# Altium footprint library ADP_SMT.PcbLib: 210 footprints (part 2 of 15)
Each footprint in its own frame and in the unit in brackets; x right, y up, seen from the top. Pads: shape width x height; smd on the part's side, far side on the other; paste and mask are expansions set on the pad; w line width, h text height; cw(c..) or ccw(c..) is an arc to the next point about the centre after c.
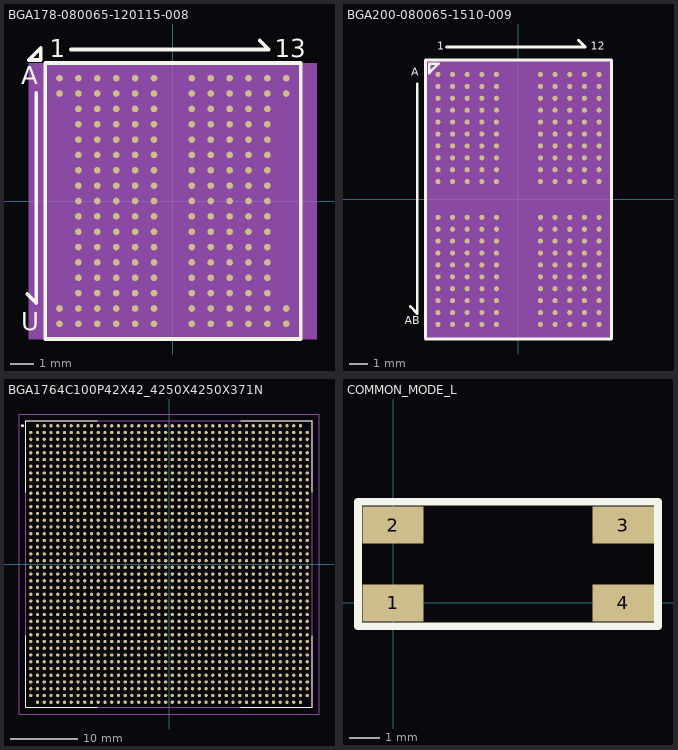
[diagram p1: the footprints below, top view; thin cyan lines are the x and y axes]

## BGA178-080065-120115-008 [mil] "BGA178-080065-120115-008"
pads (178):
  round 11 smd: A1(-189,204.72) A2(-157.5,204.72) A3(-126,204.72) A4(-94.5,204.72) A5(-63,204.72) A6(-31.5,204.72) A8(31.5,204.72) A9(63,204.72) A10(94.5,204.72) A11(126,204.72) A12(157.5,204.72) A13(189,204.72) B1(-189,179.13) B2(-157.5,179.13) B3(-126,179.13) B4(-94.5,179.13) B5(-63,179.13) B6(-31.5,179.13) B8(31.5,179.13) B9(63,179.13) B10(94.5,179.13) B11(126,179.13) B12(157.5,179.13) B13(189,179.13) C2(-157.5,153.54) C3(-126,153.54) C4(-94.5,153.54) C5(-63,153.54) C6(-31.5,153.54) C8(31.5,153.54) C9(63,153.54) C10(94.5,153.54) C11(126,153.54) C12(157.5,153.54) D2(-157.5,127.95) D3(-126,127.95) D4(-94.5,127.95) D5(-63,127.95) D6(-31.5,127.95) D8(31.5,127.95) D9(63,127.95) D10(94.5,127.95) D11(126,127.95) D12(157.5,127.95) E2(-157.5,102.36) E3(-126,102.36) E4(-94.5,102.36) E5(-63,102.36) E6(-31.5,102.36) E8(31.5,102.36) E9(63,102.36) E10(94.5,102.36) E11(126,102.36) E12(157.5,102.36) F2(-157.5,76.77) F3(-126,76.77) F4(-94.5,76.77) F5(-63,76.77) F6(-31.5,76.77) F8(31.5,76.77) F9(63,76.77) F10(94.5,76.77) F11(126,76.77) F12(157.5,76.77) G2(-157.5,51.18) G3(-126,51.18) G4(-94.5,51.18) G5(-63,51.18) G6(-31.5,51.18) G8(31.5,51.18) G9(63,51.18) G10(94.5,51.18) G11(126,51.18) G12(157.5,51.18) H2(-157.5,25.59) H3(-126,25.59) H4(-94.5,25.59) H5(-63,25.59) H6(-31.5,25.59) H8(31.5,25.59) H9(63,25.59) H10(94.5,25.59) H11(126,25.59) H12(157.5,25.59) J2(-157.5,0) J3(-126,0) J4(-94.5,0) J5(-63,0) J6(-31.5,0) J8(31.5,0) J9(63,0) J10(94.5,0) J11(126,0) J12(157.5,0) K2(-157.5,-25.59) K3(-126,-25.59) K4(-94.5,-25.59) K5(-63,-25.59) K6(-31.5,-25.59) K8(31.5,-25.59) K9(63,-25.59) K10(94.5,-25.59) K11(126,-25.59) K12(157.5,-25.59) L2(-157.5,-51.18) L3(-126,-51.18) L4(-94.5,-51.18) L5(-63,-51.18) L6(-31.5,-51.18) L8(31.5,-51.18) L9(63,-51.18) L10(94.5,-51.18) L11(126,-51.18) L12(157.5,-51.18) M2(-157.5,-76.77) M3(-126,-76.77) M4(-94.5,-76.77) M5(-63,-76.77) M6(-31.5,-76.77) M8(31.5,-76.77) M9(63,-76.77) M10(94.5,-76.77) M11(126,-76.77) M12(157.5,-76.77) N2(-157.5,-102.36) N3(-126,-102.36) N4(-94.5,-102.36) N5(-63,-102.36) N6(-31.5,-102.36) N8(31.5,-102.36) N9(63,-102.36) N10(94.5,-102.36) N11(126,-102.36) N12(157.5,-102.36) P2(-157.5,-127.95) P3(-126,-127.95) P4(-94.5,-127.95) P5(-63,-127.95) P6(-31.5,-127.95) P8(31.5,-127.95) P9(63,-127.95) P10(94.5,-127.95) P11(126,-127.95) P12(157.5,-127.95) R2(-157.5,-153.54) R3(-126,-153.54) R4(-94.5,-153.54) R5(-63,-153.54) R6(-31.5,-153.54) R8(31.5,-153.54) R9(63,-153.54) R10(94.5,-153.54) R11(126,-153.54) R12(157.5,-153.54) T1(-189,-179.13) T2(-157.5,-179.13) T3(-126,-179.13) T4(-94.5,-179.13) T5(-63,-179.13) T6(-31.5,-179.13) T8(31.5,-179.13) T9(63,-179.13) T10(94.5,-179.13) T11(126,-179.13) T12(157.5,-179.13) T13(189,-179.13) U1(-189,-204.72) U2(-157.5,-204.72) U3(-126,-204.72) U4(-94.5,-204.72) U5(-63,-204.72) U6(-31.5,-204.72) U8(31.5,-204.72) U9(63,-204.72) U10(94.5,-204.72) U11(126,-204.72) U12(157.5,-204.72) U13(189,-204.72)
Top Overlay:
  lines w6: -243,-155 -228,-170 -228,180 ; -170,252.5 160,252.5 145,267.5 ; -240,235 -220,235 -220,255 -240,235 ; -213,-230 213,-230 213,230 -213,230 -213,-230
  text "13" at 170,240 h30
  text "1" at -205,240 h30
  text "U" at -253,-215 h30
  text "A" at -253,195 h30
Mechanical 6:
  text "BGA178-080065" at -185,275 h30
Top 3D Body:
  region: -240,230 -240,-230 240,-230 240,230
Top Assembly:
  text "K9" at 71,-27.57 h0.01
  text "C4" at -86.5,151.56 h0.01
  text "K4" at -86.5,-27.57 h0.01
  text "L4" at -86.5,-53.16 h0.01
  text "B4" at -86.5,177.15 h0.01
  text "U12" at 165.5,-206.7 h0.01
  text "B13" at 197,177.15 h0.01
  text "A13" at 197,202.74 h0.01
  text "B1" at -181,177.15 h0.01
  text "T1" at -181,-181.11 h0.01
  text "T13" at 197,-181.11 h0.01
  text "U1" at -181,-206.7 h0.01
  text "U13" at 197,-206.7 h0.01
  text "U2" at -149.5,-206.7 h0.01
  text "A1" at -181,202.74 h0.01
  text "A2" at -149.5,202.74 h0.01
  text "A12" at 165.5,202.74 h0.01
  text "F12" at 165.5,74.79 h0.01
  text "G9" at 71,49.2 h0.01
  text "M4" at -86.5,-78.75 h0.01
  text "C5" at -55,151.56 h0.01
  text "B5" at -55,177.15 h0.01
  text "F5" at -55,74.79 h0.01
  text "F6" at -23.5,74.79 h0.01
  text "H2" at -149.5,23.61 h0.01
  text "N4" at -86.5,-104.34 h0.01
  text "P3" at -118,-129.93 h0.01
  text "P12" at 165.5,-129.93 h0.01
  text "T12" at 165.5,-181.11 h0.01
  text "J12" at 165.5,-1.98 h0.01
  text "M12" at 165.5,-78.75 h0.01
  text "D12" at 165.5,125.97 h0.01
  text "B12" at 165.5,177.15 h0.01
  text "L9" at 71,-53.16 h0.01
  text "K10" at 102.5,-27.57 h0.01
  text "H10" at 102.5,23.61 h0.01
  text "R4" at -86.5,-155.52 h0.01
  text "T2" at -149.5,-181.11 h0.01
  text "T3" at -118,-181.11 h0.01
  text "T4" at -86.5,-181.11 h0.01
  text "T5" at -55,-181.11 h0.01
  text "T6" at -23.5,-181.11 h0.01
  text "J4" at -86.5,-1.98 h0.01
  text "K2" at -149.5,-27.57 h0.01
  text "M5" at -55,-78.75 h0.01
  text "L6" at -23.5,-53.16 h0.01
  text "N5" at -55,-104.34 h0.01
  text "E6" at -23.5,100.38 h0.01
  text "F4" at -86.5,74.79 h0.01
  text "E5" at -55,100.38 h0.01
  text "G4" at -86.5,49.2 h0.01
  text "E4" at -86.5,100.38 h0.01
  text "D3" at -118,125.97 h0.01
  text "B6" at -23.5,177.15 h0.01
  text "C3" at -118,151.56 h0.01
  text "B2" at -149.5,177.15 h0.01
  text "M6" at -23.5,-78.75 h0.01
  text "G3" at -118,49.2 h0.01
  text "R6" at -23.5,-155.52 h0.01
  text "R5" at -55,-155.52 h0.01
  text "C6" at -23.5,151.56 h0.01
  text "G6" at -23.5,49.2 h0.01
  text "N6" at -23.5,-104.34 h0.01
  text "P9" at 71,-129.93 h0.01
  text "N9" at 71,-104.34 h0.01
  text "N10" at 102.5,-104.34 h0.01
  text "N11" at 134,-104.34 h0.01
  text "M8" at 39.5,-78.75 h0.01
  text "M9" at 71,-78.75 h0.01
  text "M10" at 102.5,-78.75 h0.01
  text "M11" at 134,-78.75 h0.01
  text "F11" at 134,74.79 h0.01
  text "F10" at 102.5,74.79 h0.01
  text "F9" at 71,74.79 h0.01
  text "F8" at 39.5,74.79 h0.01
  text "E11" at 134,100.38 h0.01
  text "E10" at 102.5,100.38 h0.01
  text "E9" at 71,100.38 h0.01
  text "D9" at 71,125.97 h0.01
  text "T8" at 39.5,-181.11 h0.01
  text "T9" at 71,-181.11 h0.01
  text "T10" at 102.5,-181.11 h0.01
  text "T11" at 134,-181.11 h0.01
  text "R8" at 39.5,-155.52 h0.01
  text "R9" at 71,-155.52 h0.01
  text "R10" at 102.5,-155.52 h0.01
  text "R11" at 134,-155.52 h0.01
  text "C11" at 134,151.56 h0.01
  text "C10" at 102.5,151.56 h0.01
  text "C9" at 71,151.56 h0.01
  text "C8" at 39.5,151.56 h0.01
  text "B11" at 134,177.15 h0.01
  text "B10" at 102.5,177.15 h0.01
  text "B9" at 71,177.15 h0.01
  text "B8" at 39.5,177.15 h0.01
  text "R2" at -149.5,-155.52 h0.01
  text "P2" at -149.5,-129.93 h0.01
  text "N2" at -149.5,-104.34 h0.01
  text "N3" at -118,-104.34 h0.01
  text "M3" at -118,-78.75 h0.01
  text "F3" at -118,74.79 h0.01
  text "E3" at -118,100.38 h0.01
  text "E2" at -149.5,100.38 h0.01
  text "D2" at -149.5,125.97 h0.01
  text "C2" at -149.5,151.56 h0.01
  text "J2" at -149.5,-1.98 h0.01
  text "J3" at -118,-1.98 h0.01
  text "L3" at -118,-53.16 h0.01
  text "K3" at -118,-27.57 h0.01
  text "L11" at 134,-53.16 h0.01
  text "P11" at 134,-129.93 h0.01
  text "D11" at 134,125.97 h0.01
  text "D10" at 102.5,125.97 h0.01
  text "P10" at 102.5,-129.93 h0.01
  text "G10" at 102.5,49.2 h0.01
  text "L10" at 102.5,-53.16 h0.01
  text "G11" at 134,49.2 h0.01
  text "L8" at 39.5,-53.16 h0.01
  text "G8" at 39.5,49.2 h0.01
  text "P8" at 39.5,-129.93 h0.01
  text "D8" at 39.5,125.97 h0.01
  text "H4" at -86.5,23.61 h0.01
  text "J11" at 134,-1.98 h0.01
  text "A8" at 39.5,202.74 h0.01
  text "H5" at -55,23.61 h0.01
  text "J9" at 71,-1.98 h0.01
  text "R12" at 165.5,-155.52 h0.01
  text "U11" at 134,-206.7 h0.01
  text "N12" at 165.5,-104.34 h0.01
  text "K11" at 134,-27.57 h0.01
  text "K12" at 165.5,-27.57 h0.01
  text "L12" at 165.5,-53.16 h0.01
  text "H11" at 134,23.61 h0.01
  text "J10" at 102.5,-1.98 h0.01
  text "H12" at 165.5,23.61 h0.01
  text "G12" at 165.5,49.2 h0.01
  text "C12" at 165.5,151.56 h0.01
  text "E12" at 165.5,100.38 h0.01
  text "A11" at 134,202.74 h0.01
  text "U9" at 71,-206.7 h0.01
  text "U8" at 39.5,-206.7 h0.01
  text "H9" at 71,23.61 h0.01
  text "K8" at 39.5,-27.57 h0.01
  text "N8" at 39.5,-104.34 h0.01
  text "K6" at -23.5,-27.57 h0.01
  text "H8" at 39.5,23.61 h0.01
  text "E8" at 39.5,100.38 h0.01
  text "A9" at 71,202.74 h0.01
  text "P6" at -23.5,-129.93 h0.01
  text "P5" at -55,-129.93 h0.01
  text "P4" at -86.5,-129.93 h0.01
  text "J6" at -23.5,-1.98 h0.01
  text "J5" at -55,-1.98 h0.01
  text "L2" at -149.5,-53.16 h0.01
  text "M2" at -149.5,-78.75 h0.01
  text "K5" at -55,-27.57 h0.01
  text "H6" at -23.5,23.61 h0.01
  text "D6" at -23.5,125.97 h0.01
  text "D5" at -55,125.97 h0.01
  text "G5" at -55,49.2 h0.01
  text "D4" at -86.5,125.97 h0.01
  text "H3" at -118,23.61 h0.01
  text "G2" at -149.5,49.2 h0.01
  text "F2" at -149.5,74.79 h0.01
  text "L5" at -55,-53.16 h0.01
  text "U10" at 102.5,-206.7 h0.01
  text "U3" at -118,-206.7 h0.01
  text "U4" at -86.5,-206.7 h0.01
  text "U5" at -55,-206.7 h0.01
  text "U6" at -23.5,-206.7 h0.01
  text "A4" at -86.5,202.74 h0.01
  text "A10" at 102.5,202.74 h0.01
  text "A6" at -23.5,202.74 h0.01
  text "A5" at -55,202.74 h0.01
  text "A3" at -118,202.74 h0.01
  text "J8" at 39.5,-1.98 h0.01
  text "B3" at -118,177.15 h0.01
  text "R3" at -118,-155.52 h0.01
3D body: height 150, standoff 0, extent -240,-230 240,230

## BGA200-080065-1510-009 [mil] "BGA200-080065-1510-009"
pads (200):
  round 11 smd: A1(-173.25,268.69) A2(-141.75,268.69) A3(-110.25,268.69) A4(-78.75,268.69) A5(-47.25,268.69) A8(47.25,268.69) A9(78.75,268.69) A10(110.25,268.69) A11(141.75,268.69) A12(173.25,268.69) AA1(-173.25,-243.11) AA2(-141.75,-243.11) AA3(-110.25,-243.11) AA4(-78.75,-243.11) AA5(-47.25,-243.11) AA8(47.25,-243.11) AA9(78.75,-243.11) AA10(110.25,-243.11) AA11(141.75,-243.11) AA12(173.25,-243.11) AB1(-173.25,-268.7) AB2(-141.75,-268.7) AB3(-110.25,-268.7) AB4(-78.75,-268.7) AB5(-47.25,-268.7) AB8(47.25,-268.7) AB9(78.75,-268.7) AB10(110.25,-268.7) AB11(141.75,-268.7) AB12(173.25,-268.7) B1(-173.25,243.1) B2(-141.75,243.1) B3(-110.25,243.1) B4(-78.75,243.1) B5(-47.25,243.1) B8(47.25,243.1) B9(78.75,243.1) B10(110.25,243.1) B11(141.75,243.1) B12(173.25,243.1) C1(-173.25,217.51) C2(-141.75,217.51) C3(-110.25,217.51) C4(-78.75,217.51) C5(-47.25,217.51) C8(47.25,217.51) C9(78.75,217.51) C10(110.25,217.51) C11(141.75,217.51) C12(173.25,217.51) D1(-173.25,191.92) D2(-141.75,191.92) D3(-110.25,191.92) D4(-78.75,191.92) D5(-47.25,191.92) D8(47.25,191.92) D9(78.75,191.92) D10(110.25,191.92) D11(141.75,191.92) D12(173.25,191.92) E1(-173.25,166.33) E2(-141.75,166.33) E3(-110.25,166.33) E4(-78.75,166.33) E5(-47.25,166.33) E8(47.25,166.33) E9(78.75,166.33) E10(110.25,166.33) E11(141.75,166.33) E12(173.25,166.33) F1(-173.25,140.74) F2(-141.75,140.74) F3(-110.25,140.74) F4(-78.75,140.74) F5(-47.25,140.74) F8(47.25,140.74) F9(78.75,140.74) F10(110.25,140.74) F11(141.75,140.74) F12(173.25,140.74) G1(-173.25,115.15) G2(-141.75,115.15) G3(-110.25,115.15) G4(-78.75,115.15) G5(-47.25,115.15) G8(47.25,115.15) G9(78.75,115.15) G10(110.25,115.15) G11(141.75,115.15) G12(173.25,115.15) H1(-173.25,89.56) H2(-141.75,89.56) H3(-110.25,89.56) H4(-78.75,89.56) H5(-47.25,89.56) H8(47.25,89.56) H9(78.75,89.56) H10(110.25,89.56) H11(141.75,89.56) H12(173.25,89.56) J1(-173.25,63.97) J2(-141.75,63.97) J3(-110.25,63.97) J4(-78.75,63.97) J5(-47.25,63.97) J8(47.25,63.97) J9(78.75,63.97) J10(110.25,63.97) J11(141.75,63.97) J12(173.25,63.97) K1(-173.25,38.38) K2(-141.75,38.38) K3(-110.25,38.38) K4(-78.75,38.38) K5(-47.25,38.38) K8(47.25,38.38) K9(78.75,38.38) K10(110.25,38.38) K11(141.75,38.38) K12(173.25,38.38) N1(-173.25,-38.39) N2(-141.75,-38.39) N3(-110.25,-38.39) N4(-78.75,-38.39) N5(-47.25,-38.39) N8(47.25,-38.39) N9(78.75,-38.39) N10(110.25,-38.39) N11(141.75,-38.39) N12(173.25,-38.39) P1(-173.25,-63.98) P2(-141.75,-63.98) P3(-110.25,-63.98) P4(-78.75,-63.98) P5(-47.25,-63.98) P8(47.25,-63.98) P9(78.75,-63.98) P10(110.25,-63.98) P11(141.75,-63.98) P12(173.25,-63.98) R1(-173.25,-89.57) R2(-141.75,-89.57) R3(-110.25,-89.57) R4(-78.75,-89.57) R5(-47.25,-89.57) R8(47.25,-89.57) R9(78.75,-89.57) R10(110.25,-89.57) R11(141.75,-89.57) R12(173.25,-89.57) T1(-173.25,-115.16) T2(-141.75,-115.16) T3(-110.25,-115.16) T4(-78.75,-115.16) T5(-47.25,-115.16) T8(47.25,-115.16) T9(78.75,-115.16) T10(110.25,-115.16) T11(141.75,-115.16) T12(173.25,-115.16) U1(-173.25,-140.75) U2(-141.75,-140.75) U3(-110.25,-140.75) U4(-78.75,-140.75) U5(-47.25,-140.75) U8(47.25,-140.75) U9(78.75,-140.75) U10(110.25,-140.75) U11(141.75,-140.75) U12(173.25,-140.75) V1(-173.25,-166.34) V2(-141.75,-166.34) V3(-110.25,-166.34) V4(-78.75,-166.34) V5(-47.25,-166.34) V8(47.25,-166.34) V9(78.75,-166.34) V10(110.25,-166.34) V11(141.75,-166.34) V12(173.25,-166.34) W1(-173.25,-191.93) W2(-141.75,-191.93) W3(-110.25,-191.93) W4(-78.75,-191.93) W5(-47.25,-191.93) W8(47.25,-191.93) W9(78.75,-191.93) W10(110.25,-191.93) W11(141.75,-191.93) W12(173.25,-191.93) Y1(-173.25,-217.52) Y2(-141.75,-217.52) Y3(-110.25,-217.52) Y4(-78.75,-217.52) Y5(-47.25,-217.52) Y8(47.25,-217.52) Y9(78.75,-217.52) Y10(110.25,-217.52) Y11(141.75,-217.52) Y12(173.25,-217.52)
Top Overlay:
  lines w6: -232.5,-230 -217.5,-245 -217.5,249 ; -155,327.5 143.5,327.5 128.5,342.5 ; -200,-300 -200,300 200,300 200,-300 -200,-300 ; -192,272 -172,292 -192,292 -192,272
  text "AB" at -245,-275 h30
  text "12" at 155,315 h30
  text "1" at -175,315 h30
  text "A" at -230,260 h30
  text ".Designator" at -155,350 h30
Top 3D Body:
  region: -200,300 -200,-300 200,-300 200,300
Mechanical 13:
  text "G8" at 55.23,113.15 h0.01
  text "E12" at 181.23,164.33 h0.01
  text "J12" at 181.23,61.97 h0.01
  text "A3" at -102.27,266.69 h0.01
  text "E8" at 55.23,164.33 h0.01
  text "G10" at 118.23,113.15 h0.01
  text "K11" at 149.73,36.38 h0.01
  text "AB3" at -102.27,-270.7 h0.01
  text "Y1" at -165.27,-219.52 h0.01
  text "W2" at -133.77,-193.93 h0.01
  text "V1" at -165.27,-168.34 h0.01
  text "T1" at -165.27,-117.16 h0.01
  text "T3" at -102.27,-117.16 h0.01
  text "P1" at -165.27,-65.98 h0.01
  text "P3" at -102.27,-65.98 h0.01
  text "N2" at -133.77,-40.39 h0.01
  text "J1" at -165.27,61.97 h0.01
  text "J3" at -102.27,61.97 h0.01
  text "G3" at -102.27,113.15 h0.01
  text "E1" at -165.27,164.33 h0.01
  text "D2" at -133.77,189.92 h0.01
  text "C1" at -165.27,215.51 h0.01
  text "AB5" at -39.27,-270.7 h0.01
  text "Y5" at -39.27,-219.52 h0.01
  text "W4" at -70.77,-193.93 h0.01
  text "V5" at -39.27,-168.34 h0.01
  text "T5" at -39.27,-117.16 h0.01
  text "N4" at -70.77,-40.39 h0.01
  text "K4" at -70.77,36.38 h0.01
  text "G5" at -39.27,113.15 h0.01
  text "E5" at -39.27,164.33 h0.01
  text "D4" at -70.77,189.92 h0.01
  text "C5" at -39.27,215.51 h0.01
  text "AB8" at 55.23,-270.7 h0.01
  text "W11" at 149.73,-193.93 h0.01
  text "AB10" at 118.22,-270.7 h0.01
  text "T8" at 55.23,-117.16 h0.01
  text "V8" at 55.23,-168.34 h0.01
  text "V12" at 181.23,-168.34 h0.01
  text "W9" at 86.73,-193.93 h0.01
  text "Y8" at 55.23,-219.52 h0.01
  text "Y12" at 181.23,-219.52 h0.01
  text "N9" at 86.73,-40.39 h0.01
  text "T10" at 118.23,-117.16 h0.01
  text "T12" at 181.23,-117.16 h0.01
  text "N11" at 149.73,-40.39 h0.01
  text "P12" at 181.23,-65.98 h0.01
  text "P10" at 118.23,-65.98 h0.01
  text "K9" at 86.73,36.38 h0.01
  text "J10" at 118.23,61.97 h0.01
  text "G12" at 181.23,113.15 h0.01
  text "D9" at 86.73,189.92 h0.01
  text "D11" at 149.73,189.92 h0.01
  text "C8" at 55.23,215.51 h0.01
  text "C12" at 181.23,215.51 h0.01
  text "A10" at 118.23,266.69 h0.01
  text "K2" at -133.77,36.38 h0.01
  text "G1" at -165.27,113.15 h0.01
  text "E9" at 86.73,164.33 h0.01
  text "G9" at 86.73,113.15 h0.01
  text "F12" at 181.23,138.74 h0.01
  text "G4" at -70.77,113.15 h0.01
  text "F1" at -165.27,138.74 h0.01
  text "T9" at 86.73,-117.16 h0.01
  text "U12" at 181.23,-142.75 h0.01
  text "T4" at -70.77,-117.16 h0.01
  text "U1" at -165.27,-142.75 h0.01
  text "H4" at -70.77,87.56 h0.01
  text "F4" at -70.77,138.74 h0.01
  text "J11" at 149.73,61.97 h0.01
  text "B4" at -70.77,241.1 h0.01
  text "T11" at 149.73,-117.16 h0.01
  text "H9" at 86.73,87.56 h0.01
  text "J2" at -133.77,61.97 h0.01
  text "C3" at -102.27,215.51 h0.01
  text "E2" at -133.77,164.33 h0.01
  text "D10" at 118.23,189.92 h0.01
  text "D3" at -102.27,189.92 h0.01
  text "J4" at -70.77,61.97 h0.01
  text "C2" at -133.77,215.51 h0.01
  text "E4" at -70.77,164.33 h0.01
  text "H2" at -133.77,87.56 h0.01
  text "C9" at 86.73,215.51 h0.01
  text "C4" at -70.77,215.51 h0.01
  text "F2" at -133.77,138.74 h0.01
  text "E11" at 149.73,164.33 h0.01
  text "E10" at 118.23,164.33 h0.01
  text "C11" at 149.73,215.51 h0.01
  text "J9" at 86.73,61.97 h0.01
  text "B2" at -133.77,241.1 h0.01
  text "G2" at -133.77,113.15 h0.01
  text "A5" at -39.27,266.69 h0.01
  text "E3" at -102.27,164.33 h0.01
  text "B11" at 149.73,241.1 h0.01
  text "C10" at 118.23,215.51 h0.01
  text "H11" at 149.73,87.56 h0.01
  text "H10" at 118.23,87.56 h0.01
  text "F11" at 149.73,138.74 h0.01
  text "J8" at 55.23,61.97 h0.01
  text "B9" at 86.73,241.1 h0.01
  text "F9" at 86.73,138.74 h0.01
  text "F8" at 55.23,138.74 h0.01
  text "H12" at 181.23,87.56 h0.01
  text "A4" at -70.77,266.69 h0.01
  text "H8" at 55.23,87.56 h0.01
  text "A9" at 86.73,266.69 h0.01
  text "F10" at 118.23,138.74 h0.01
  text "D12" at 181.23,189.92 h0.01
  text "B10" at 118.23,241.1 h0.01
  text "D5" at -39.27,189.92 h0.01
  text "D8" at 55.23,189.92 h0.01
  text "B8" at 55.23,241.1 h0.01
  text "B5" at -39.27,241.1 h0.01
  text "F5" at -39.27,138.74 h0.01
  text "F3" at -102.27,138.74 h0.01
  text "D1" at -165.27,189.92 h0.01
  text "B3" at -102.27,241.1 h0.01
  text "K12" at 181.23,36.38 h0.01
  text "K10" at 118.23,36.38 h0.01
  text "H5" at -39.27,87.56 h0.01
  text "H1" at -165.27,87.56 h0.01
  text "K1" at -165.27,36.38 h0.01
  text "K3" at -102.27,36.38 h0.01
  text "U10" at 118.23,-142.75 h0.01
  text "N10" at 118.23,-40.39 h0.01
  text "N12" at 181.23,-40.39 h0.01
  text "R12" at 181.23,-91.57 h0.01
  text "U5" at -39.27,-142.75 h0.01
  text "R5" at -39.27,-91.57 h0.01
  text "U8" at 55.23,-142.75 h0.01
  text "R8" at 55.23,-91.57 h0.01
  text "U3" at -102.27,-142.75 h0.01
  text "R1" at -165.27,-91.57 h0.01
  text "N1" at -165.27,-40.39 h0.01
  text "N3" at -102.27,-40.39 h0.01
  text "AB9" at 86.73,-270.7 h0.01
  text "W12" at 181.23,-193.93 h0.01
  text "AA10" at 118.22,-245.11 h0.01
  text "AA5" at -39.27,-245.11 h0.01
  text "W5" at -39.27,-193.93 h0.01
  text "W8" at 55.23,-193.93 h0.01
  text "AA8" at 55.23,-245.11 h0.01
  text "AA3" at -102.27,-245.11 h0.01
  text "W1" at -165.27,-193.93 h0.01
  text "AB4" at -70.77,-270.7 h0.01
  text "P2" at -133.77,-65.98 h0.01
  text "N8" at 55.23,-40.39 h0.01
  text "N5" at -39.27,-40.39 h0.01
  text "K8" at 55.23,36.38 h0.01
  text "K5" at -39.27,36.38 h0.01
  text "AA11" at 149.72,-245.11 h0.01
  text "AA9" at 86.73,-245.11 h0.01
  text "AA4" at -70.77,-245.11 h0.01
  text "AA2" at -133.77,-245.11 h0.01
  text "J5" at -39.27,61.97 h0.01
  text "Y11" at 149.73,-219.52 h0.01
  text "Y10" at 118.23,-219.52 h0.01
  text "Y9" at 86.73,-219.52 h0.01
  text "Y4" at -70.77,-219.52 h0.01
  text "Y3" at -102.27,-219.52 h0.01
  text "Y2" at -133.77,-219.52 h0.01
  text "W10" at 118.23,-193.93 h0.01
  text "W3" at -102.27,-193.93 h0.01
  text "V11" at 149.73,-168.34 h0.01
  text "V10" at 118.23,-168.34 h0.01
  text "H3" at -102.27,87.56 h0.01
  text "V9" at 86.73,-168.34 h0.01
  text "V4" at -70.77,-168.34 h0.01
  text "V3" at -102.27,-168.34 h0.01
  text "V2" at -133.77,-168.34 h0.01
  text "U11" at 149.73,-142.75 h0.01
  text "U9" at 86.73,-142.75 h0.01
  text "U4" at -70.77,-142.75 h0.01
  text "U2" at -133.77,-142.75 h0.01
  text "T2" at -133.77,-117.16 h0.01
  text "R11" at 149.73,-91.57 h0.01
  text "G11" at 149.73,113.15 h0.01
  text "R10" at 118.23,-91.57 h0.01
  text "R9" at 86.73,-91.57 h0.01
  text "R4" at -70.77,-91.57 h0.01
  text "R3" at -102.27,-91.57 h0.01
  text "R2" at -133.77,-91.57 h0.01
  text "P11" at 149.73,-65.98 h0.01
  text "P9" at 86.73,-65.98 h0.01
  text "P8" at 55.23,-65.98 h0.01
  text "P5" at -39.27,-65.98 h0.01
  text "P4" at -70.77,-65.98 h0.01
  text "A8" at 55.23,266.69 h0.01
  text "AB1" at -165.27,-270.7 h0.01
  text "AA12" at 181.22,-245.11 h0.01
  text "AA1" at -165.27,-245.11 h0.01
  text "B12" at 181.23,241.1 h0.01
  text "B1" at -165.27,241.1 h0.01
  text "A12" at 181.23,266.69 h0.01
  text "A11" at 149.73,266.69 h0.01
  text "A2" at -133.77,266.69 h0.01
  text "AB12" at 181.22,-270.7 h0.01
  text "AB11" at 149.72,-270.7 h0.01
  text "AB2" at -133.77,-270.7 h0.01
  text "A1" at -165.27,266.69 h0.01
3D body: height 150, standoff 0, extent -200,-300 200,300
